# Altium footprint library LM2596 Buck Converter.PcbLib: 1 footprints
Each footprint in its own frame and in the unit in brackets; x right, y up, seen from the top. Pads: shape width x height; smd on the part's side, far side on the other; paste and mask are expansions set on the pad; w line width, h text height; cw(c..) or ccw(c..) is an arc to the next point about the centre after c.
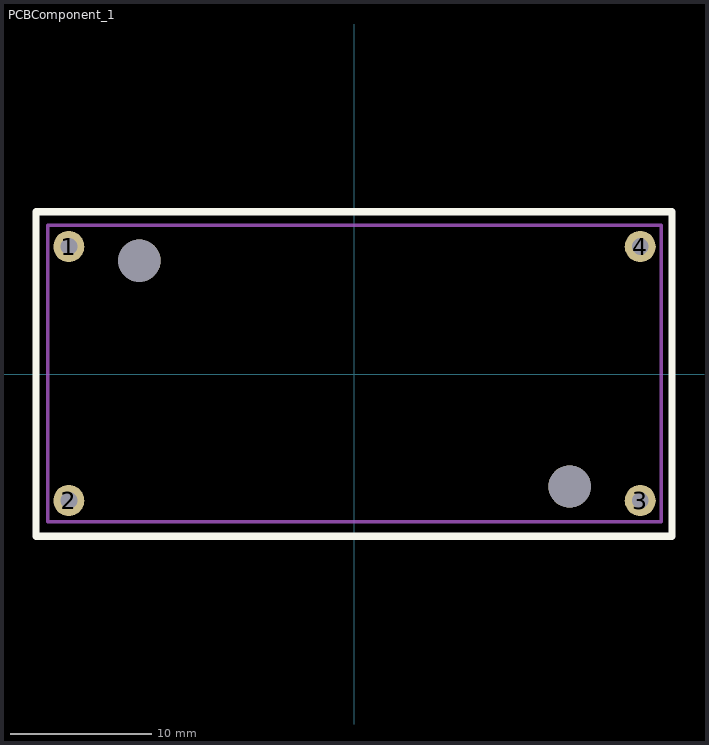
[diagram p0: the footprint, top view; thin cyan lines are the x and y axes]

## PCBComponent_1 [mm]
pads (6):
  round 2.2 hole 1.2: 1(-20.214,9.029) 2(-20.214,-8.971) 3(20.286,-8.971) 4(20.286,9.029)
  round 3 hole 3: ""(-15.214,8.029) ""(15.286,-7.971)
Top Overlay:
  lines w0.5: -22.55,-11.5 22.55,-11.5 22.55,11.5 -22.55,11.5 -22.55,-11.5
Mechanical 1:
  lines w0.254: -21.714,-10.471 21.786,-10.471 21.786,10.529 -21.714,10.529 -21.714,-10.471
3D body "YAAJ_DCDC_StepDown_LM2596_PinHeaders_cp.step": height 16.8, standoff -3, extent -21.927,-10.632 21.673,10.668